# Altium footprint library ParsaLibrary.PcbLib: 526 footprints (part 15 of 33)
Each footprint in its own frame and in the unit in brackets; x right, y up, seen from the top. Pads: shape width x height; smd on the part's side, far side on the other; paste and mask are expansions set on the pad; w line width, h text height; cw(c..) or ccw(c..) is an arc to the next point about the centre after c.
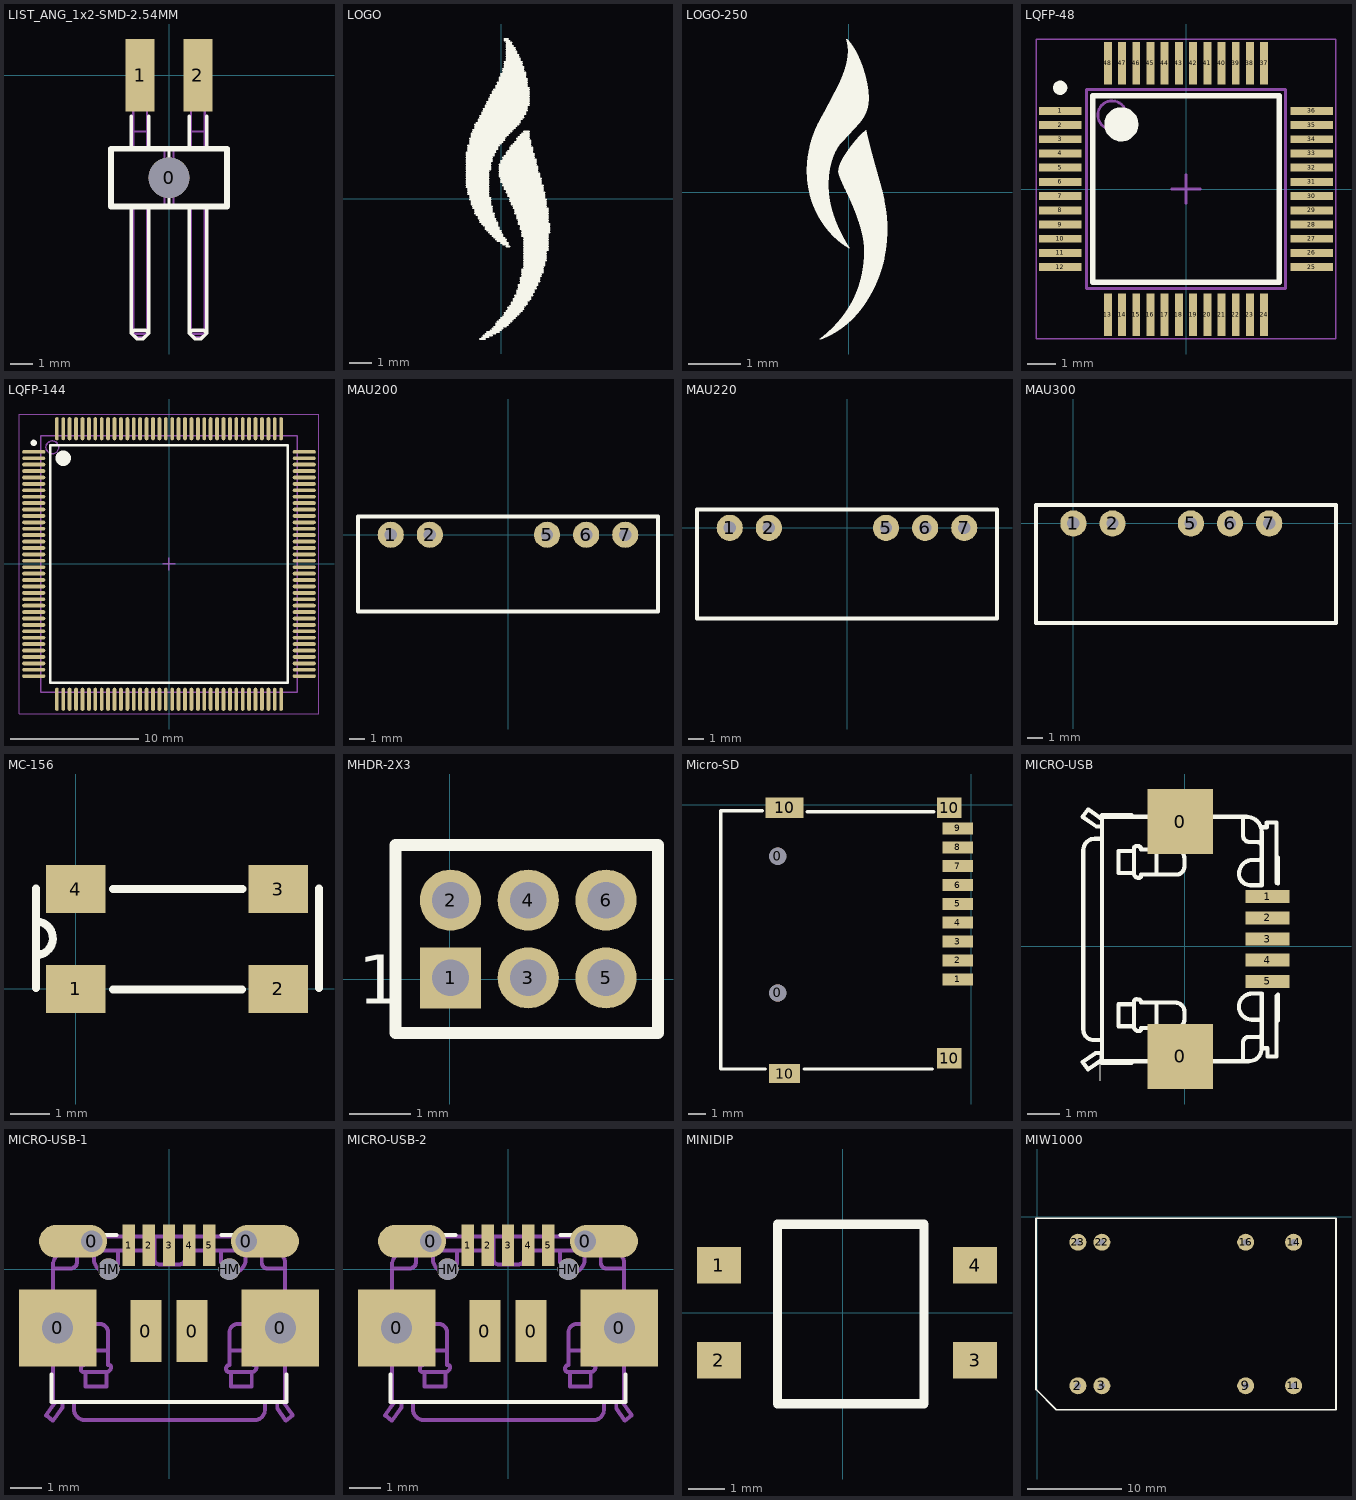
[diagram p14: the footprints below, top view; thin cyan lines are the x and y axes]

## LIST_ANG_1x2-SMD-2.54MM [mm]
pads (3):
  round 1.78 hole 1.78 unplated: 0(0,-4.496)
  rect 1.27x3.18 smd: 1(-1.27,0) 2(1.27,0)
Top Overlay:
  lines w0.15: -1.651,-5.766 -1.651,-11.324 ; -1.651,-3.226 -1.651,-1.8 ; -0.889,-5.766 -0.889,-11.324 ; -0.889,-3.226 -0.889,-1.8 ; 0,-5.766 0,-3.226 ; 0.889,-5.766 0.889,-11.324 ; 0.889,-3.226 0.889,-1.8 ; 1.651,-5.766 1.651,-11.324 ; 1.651,-3.226 1.651,-1.8 ; -1.651,-11.324 -1.524,-11.197 -1.016,-11.197 -0.889,-11.324 ; -1.651,-11.324 -1.397,-11.578 -1.143,-11.578 -0.889,-11.324 ; 0.889,-11.324 1.016,-11.197 1.524,-11.197 1.651,-11.324 ; 0.889,-11.324 1.143,-11.578 1.397,-11.578 1.651,-11.324
  lines w0.254: -2.54,-5.766 2.54,-5.766 2.54,-3.226 -2.54,-3.226 -2.54,-5.766
Mechanical 7:
  lines w0.1: -1.57,-5.766 -1.57,-11.347 ; -1.57,-3.226 -1.57,0.85 ; -1.57,-2.466 -0.97,-2.466 ; -1.57,-0.464 -0.97,-0.464 ; -0.97,-5.766 -0.97,-11.347 ; -0.97,-3.226 -0.97,0.85 ; -0.2,-5.766 -0.2,-3.226 ; 0.2,-5.766 0.2,-3.226 ; 0.97,-5.766 0.97,-11.347 ; 0.97,-3.226 0.97,0.85 ; 0.97,-2.466 1.57,-2.466 ; 0.97,-0.464 1.57,-0.464 ; 1.57,-5.766 1.57,-11.347 ; 1.57,-3.226 1.57,0.85 ; -1.57,-11.347 -1.42,-11.497 -1.12,-11.497 -0.97,-11.347 ; -1.57,-11.347 -0.97,-11.347 ; -1.57,0.85 -1.42,1 -1.12,1 -0.97,0.85 ; -1.57,0.85 -0.97,0.85 ; 0.97,-11.347 1.12,-11.497 1.42,-11.497 1.57,-11.347 ; 0.97,-11.347 1.57,-11.347 ; 0.97,0.85 1.12,1 1.42,1 1.57,0.85 ; 0.97,0.85 1.57,0.85 ; -2.54,-5.766 2.54,-5.766 2.54,-3.226 -2.54,-3.226 -2.54,-5.766
  text ".Designator" at -2,-4.7 h0.38
3D body "Samtec-TSM-102-01-L-SH-A.step": height 3.03, standoff -1.41, extent -2.56,-11.605 2.52,1.349

## LOGO [mm]
Top Overlay:
  drawing of 240 lines, arcs and shapes, not listed

## LOGO-250 [mm]
Top Overlay:
  drawing of 1676 lines, arcs and shapes, not listed

## LQFP-48 [mm]
pads (48):
  rect 1.5x0.28 smd: 1(-4.425,2.75) 2(-4.425,2.25) 3(-4.425,1.75) 4(-4.425,1.25) 5(-4.425,0.75) 6(-4.425,0.25) 7(-4.425,-0.25) 8(-4.425,-0.75) 9(-4.425,-1.25) 10(-4.425,-1.75) 11(-4.425,-2.25) 12(-4.425,-2.75) 25(4.425,-2.75) 26(4.425,-2.25) 27(4.425,-1.75) 28(4.425,-1.25) 29(4.425,-0.75) 30(4.425,-0.25) 31(4.425,0.25) 32(4.425,0.75) 33(4.425,1.25) 34(4.425,1.75) 35(4.425,2.25) 36(4.425,2.75)
  rect 0.28x1.5 smd: 13(-2.75,-4.425) 14(-2.25,-4.425) 15(-1.75,-4.425) 16(-1.25,-4.425) 17(-0.75,-4.425) 18(-0.25,-4.425) 19(0.25,-4.425) 20(0.75,-4.425) 21(1.25,-4.425) 22(1.75,-4.425) 23(2.25,-4.425) 24(2.75,-4.425) 37(2.75,4.425) 38(2.25,4.425) 39(1.75,4.425) 40(1.25,4.425) 41(0.75,4.425) 42(0.25,4.425) 43(-0.25,4.425) 44(-0.75,4.425) 45(-1.25,4.425) 46(-1.75,4.425) 47(-2.25,4.425) 48(-2.75,4.425)
Top Overlay:
  circle w0.6: c-2.275,2.275 r0.3
  circle w0.25: c-4.425,3.56 r0.125
  lines w0.2: -3.275,-3.275 3.275,-3.275 3.275,3.275 -3.275,3.275 -3.275,-3.275
Mechanical 13:
  circle w0.1: c-2.6,2.6 r0.5
  lines w0.1: -3.5,-3.5 3.5,-3.5 3.5,3.5 -3.5,3.5 -3.5,-3.5
Mechanical 15:
  lines w0.05: -5.275,-5.275 5.275,-5.275 5.275,5.275 -5.275,5.275 -5.275,-5.275
  lines w0.1: -0.5,0 0.5,0 ; 0,-0.5 0,0.5
3D body "User Library-LQFP48_Grid_0_5.STEP": height 1.6, standoff 0, extent -4.5,-4.5 4.5,4.5

## LQFP-144 [mm]
pads (144):
  oval 1.8x0.3 smd: 1(-10.551,8.749) 2(-10.551,8.249) 3(-10.551,7.749) 4(-10.551,7.249) 5(-10.551,6.749) 6(-10.551,6.249) 7(-10.551,5.749) 8(-10.551,5.249) 9(-10.551,4.749) 10(-10.551,4.249) 11(-10.551,3.749) 12(-10.551,3.249) 13(-10.551,2.749) 14(-10.551,2.249) 15(-10.551,1.749) 16(-10.551,1.249) 17(-10.551,0.749) 18(-10.551,0.249) 19(-10.551,-0.251) 20(-10.551,-0.751) 21(-10.551,-1.251) 22(-10.551,-1.751) 23(-10.551,-2.251) 24(-10.551,-2.751) 25(-10.551,-3.251) 26(-10.551,-3.751) 27(-10.551,-4.251) 28(-10.551,-4.751) 29(-10.551,-5.251) 30(-10.551,-5.751) 31(-10.551,-6.251) 32(-10.551,-6.751) 33(-10.551,-7.251) 34(-10.551,-7.751) 35(-10.551,-8.251) 36(-10.551,-8.751) 73(10.549,-8.751) 74(10.549,-8.251) 75(10.549,-7.751) 76(10.549,-7.251) 77(10.549,-6.751) 78(10.549,-6.251) 79(10.549,-5.751) 80(10.549,-5.251) 81(10.549,-4.751) 82(10.549,-4.251) 83(10.549,-3.751) 84(10.549,-3.251) 85(10.549,-2.751) 86(10.549,-2.251) 87(10.549,-1.751) 88(10.549,-1.251) 89(10.549,-0.751) 90(10.549,-0.251) 91(10.549,0.249) 92(10.549,0.749) 93(10.549,1.249) 94(10.549,1.749) 95(10.549,2.249) 96(10.549,2.749) 97(10.549,3.249) 98(10.549,3.749) 99(10.549,4.249) 100(10.549,4.749) 101(10.549,5.249) 102(10.549,5.749) 103(10.549,6.249) 104(10.549,6.749) 105(10.549,7.249) 106(10.549,7.749) 107(10.549,8.249) 108(10.549,8.749)
  oval 0.3x1.8 smd: 37(-8.751,-10.551) 38(-8.251,-10.551) 39(-7.751,-10.551) 40(-7.251,-10.551) 41(-6.751,-10.551) 42(-6.251,-10.551) 43(-5.751,-10.551) 44(-5.251,-10.551) 45(-4.751,-10.551) 46(-4.251,-10.551) 47(-3.751,-10.551) 48(-3.251,-10.551) 49(-2.751,-10.551) 50(-2.251,-10.551) 51(-1.751,-10.551) 52(-1.251,-10.551) 53(-0.751,-10.551) 54(-0.251,-10.551) 55(0.249,-10.551) 56(0.749,-10.551) 57(1.249,-10.551) 58(1.749,-10.551) 59(2.249,-10.551) 60(2.749,-10.551) 61(3.249,-10.551) 62(3.749,-10.551) 63(4.249,-10.551) 64(4.749,-10.551) 65(5.249,-10.551) 66(5.749,-10.551) 67(6.249,-10.551) 68(6.749,-10.551) 69(7.249,-10.551) 70(7.749,-10.551) 71(8.249,-10.551) 72(8.749,-10.551) 109(8.749,10.549) 110(8.249,10.549) 111(7.749,10.549) 112(7.249,10.549) 113(6.749,10.549) 114(6.249,10.549) 115(5.749,10.549) 116(5.249,10.549) 117(4.749,10.549) 118(4.249,10.549) 119(3.749,10.549) 120(3.249,10.549) 121(2.749,10.549) 122(2.249,10.549) 123(1.749,10.549) 124(1.249,10.549) 125(0.749,10.549) 126(0.249,10.549) 127(-0.251,10.549) 128(-0.751,10.549) 129(-1.251,10.549) 130(-1.751,10.549) 131(-2.251,10.549) 132(-2.751,10.549) 133(-3.251,10.549) 134(-3.751,10.549) 135(-4.251,10.549) 136(-4.751,10.549) 137(-5.251,10.549) 138(-5.751,10.549) 139(-6.251,10.549) 140(-6.751,10.549) 141(-7.251,10.549) 142(-7.751,10.549) 143(-8.251,10.549) 144(-8.751,10.549)
Top Overlay:
  circle w0.25: c-10.551,9.449 r0.125
  circle w0.6: c-8.251,8.249 r0.3
  lines w0.2: -9.251,-9.251 -9.251,9.249 9.249,9.249 9.249,-9.251 -9.251,-9.251
Mechanical 13:
  circle w0.1: c-9.101,9.099 r0.5
  lines w0.1: -10.001,-10.001 -10.001,9.999 9.999,9.999 9.999,-10.001 -10.001,-10.001
Mechanical 15:
  lines w0.05: -11.701,-11.701 -11.701,11.699 11.699,11.699 11.699,-11.701 -11.701,-11.701
  lines w0.1: -0.501,-0.001 0.499,-0.001 ; -0.001,-0.501 -0.001,0.499
3D body "User Library-LQFP144-3.STEP": height 1.8, standoff -0.09, extent -11.102,-11.102 11.1,11.1

## MAU200 [mm]
pads (5):
  round 1.7 hole 0.8: 1(-7.62,0) 2(-5.08,0) 5(2.54,0) 6(5.08,0) 7(7.62,0)
Top Overlay:
  lines w0.254: -9.75,-5 -9.75,1.2 9.75,1.2 9.75,-5 -9.75,-5
3D body "User Library-MAU.SLDPRT": height 9.7, standoff -3.7, extent -9.75,-5 9.75,1.2

## MAU220 [mm]
pads (5):
  round 1.7 hole 0.8: 1(-7.62,0) 2(-5.08,0) 5(2.54,0) 6(5.08,0) 7(7.62,0)
Top Overlay:
  lines w0.254: -9.75,-5.9 -9.75,1.2 9.75,1.2 9.75,-5.9 -9.75,-5.9
3D body: height 10.2, standoff 0, extent -9.75,-5.9 9.75,-4.9
3D body "User Library-MAU.SLDPRT": height 10.2, standoff -3.2, extent -9.75,-5 9.75,1.2

## MAU300 [mm]
pads (5):
  round 1.7 hole 0.8: 1(0,0) 2(2.54,0) 5(7.62,0) 6(10.16,0) 7(12.7,0)
Top Overlay:
  lines w0.254: -2.424,-6.468 -2.424,1.2 17.032,1.2 17.032,-6.468 -2.424,-6.468
3D body "User Library-MAU302.step": height 9.7, standoff -3.5, extent -2.433,-6.417 17.067,1.183

## MC-156 [mm]
pads (4):
  rect 1.5x1.2 smd: 1(0,0) 2(5.08,0) 3(5.08,2.5) 4(0,2.5)
Top Overlay:
  lines w0.2: -0.999,0.018 -0.999,2.518 ; -0.996,0.844 ccw(c-0.999,1.268) -0.971,1.692 ; 0.93,-0.013 4.172,-0.013 ; 0.939,2.5 4.181,2.5 ; 6.101,0.018 6.101,2.518
3D body "User Library-EA96.step": height 1.3, standoff -0.2, extent -1.012,-0.288 6.088,2.812

## MHDR-2X3 [mm]
pads (6):
  rect 1x1 hole 0.6: 1(0.011,0.019)
  round 1 hole 0.6: 2(0.011,1.289) 3(1.281,0.019) 4(1.281,1.289) 5(2.551,0.019) 6(2.551,1.289)
Top Overlay:
  lines w0.2: -0.889,-0.881 -0.889,2.189 3.4,2.189 3.4,-0.881 -0.889,-0.881
  text "1" at -1.5,-0.4 h0.8

## Micro-SD [mm]
pads (15):
  round 1 hole 1: 0(-11.287,-10.985) 0(-11.287,-3.005)
  rect 1.8x0.7 smd: 1(-0.787,-10.185) 2(-0.787,-9.085) 3(-0.787,-7.985) 4(-0.787,-6.885) 5(-0.787,-5.785) 6(-0.787,-4.685) 7(-0.787,-3.585) 8(-0.787,-2.485) 9(-0.787,-1.385)
  rect 1.8x1.1 smd: 10(-10.887,-15.685)
  rect 2.2x1.2 smd: 10(-10.887,-0.185)
  rect 1.44x1.2 smd: 10(-1.287,-14.785) 10(-1.287,-0.185)
Top Overlay:
  lines w0.2: -12.192,-0.356 -14.605,-0.356 -14.605,-15.418 -12.014,-15.418 ; -9.754,-15.418 -2.261,-15.418 ; -9.576,-0.406 -2.184,-0.406
3D body "MicroSDSlot.STEP": height 1.75, standoff -0.69, extent -14.949,-15.924 0.051,0.076

## MICRO-USB [mm]
pads (7):
  rect 2x2 smd: 0(-0.135,-3.376) 0(-0.135,3.824)
  rect 1.35x0.4 smd: 1(2.54,1.524) 2(2.54,0.874) 3(2.54,0.224) 4(2.54,-0.426) 5(2.54,-1.076)
Top Overlay:
  lines w0: -2.585,-4.126 -2.585,-3.276
  lines w0.127: -2.585,-3.276 -2.735,-3.276 -3.135,-3.551 -2.96,-3.776 -2.535,-3.476 ; -1.635,-3.576 -2.535,-3.576 -2.535,4.024 -1.635,4.024 ; -1.56,-2.476 -1.56,-1.776 ; -1.56,2.224 -1.56,2.924 ; -0.86,-2.476 -0.86,-1.726 ; -0.86,2.224 -0.86,2.974 ; 1.79,-3.501 1.79,-2.951 cw(c1.965,-2.951) 1.965,-2.776 2.29,-2.776 ccw(c2.29,-2.701) 2.365,-2.701 ; 1.79,3.949 1.79,3.399 ccw(c1.99,3.399) 1.99,3.199 2.215,3.199 cw(c2.215,3.049) 2.365,3.049 ; 2.39,3.649 2.515,3.649 2.515,3.799 2.815,3.799 2.815,1.949 ; 2.815,-1.526 2.815,-3.376 2.54,-3.376 2.54,-3.126 2.365,-3.126 ; 2.865,-2.276 2.865,-1.476 ; 2.865,1.924 2.865,2.724 ; -2.535,-3.476 -2.535,-2.876 ; -2.535,-3.476 -2.535,-3.526 1.965,-3.526 ccw(c1.965,-3.126) 2.365,-3.126 ; -2.535,-2.876 -2.535,3.299 ; -2.535,-2.876 -2.785,-2.876 cw(c-2.785,-2.551) -3.11,-2.551 -3.11,2.949 cw(c-2.76,2.949) -2.76,3.299 -2.535,3.299 ; -2.535,3.299 -2.535,3.674 ; -2.535,3.674 -2.535,3.899 ; -2.535,3.674 -2.71,3.674 -3.135,3.974 -2.96,4.199 -2.535,3.899 ; -2.535,3.899 -2.535,3.974 1.89,3.974 cw(c1.89,3.499) 2.365,3.499 2.365,3.049 ; -1.56,-1.776 -1.56,-1.701 cw(c-1.472,-1.713) -1.46,-1.626 -1.435,-1.626 cw(c-1.435,-1.726) -1.335,-1.726 -0.86,-1.726 ; -1.56,-1.776 -2.035,-1.776 -2.035,-2.451 -1.56,-2.451 ccw(c-1.41,-2.451) -1.41,-2.601 ccw(c-1.41,-2.526) -1.335,-2.526 -1.335,-2.501 -0.26,-2.501 ccw(c-0.26,-2.251) -0.01,-2.251 -0.01,-2.001 ccw(c-0.285,-2.001) -0.285,-1.726 -0.86,-1.726 ; -1.56,2.924 -1.56,2.999 cw(c-1.473,2.986) -1.46,3.074 -1.435,3.074 cw(c-1.435,2.974) -1.335,2.974 -0.86,2.974 ; -1.56,2.924 -2.035,2.924 -2.035,2.249 -1.56,2.249 ccw(c-1.41,2.249) -1.41,2.099 ccw(c-1.41,2.174) -1.335,2.174 -1.335,2.199 -0.26,2.199 ccw(c-0.26,2.449) -0.01,2.449 -0.01,2.699 ccw(c-0.285,2.699) -0.285,2.974 -0.86,2.974 ; 2.365,-3.126 2.365,-2.701 ; 2.365,-2.701 2.365,-2.251 ; 2.365,-2.251 2.365,-1.451 2.065,-1.451 ccw(c2.065,-1.851) 1.665,-1.851 ccw(c2.065,-1.851) 2.065,-2.251 2.365,-2.251 ; 2.365,2.724 cw(c2.29,2.724) 2.29,2.649 2.09,2.649 ccw(c2.09,2.224) 1.665,2.224 ccw(c2.015,2.224) 2.015,1.874 2.365,1.874 2.365,2.724 ; 2.365,2.724 2.365,3.049
Mechanical 1:
  lines w0: -0.685,-3.376 ccw(c-0.41,-3.401) -0.435,-3.676 0.165,-3.676 ccw(c0.14,-3.401) 0.415,-3.376 ccw(c0.14,-3.351) 0.165,-3.076 -0.435,-3.076 ccw(c-0.41,-3.351) -0.685,-3.376 ; -0.685,3.824 ccw(c-0.41,3.799) -0.435,3.524 0.165,3.524 ccw(c0.14,3.799) 0.415,3.824 ccw(c0.14,3.849) 0.165,4.124 -0.435,4.124 ccw(c-0.41,3.849) -0.685,3.824
3D body "User Library-10104110.step": height 2.72, standoff -0.31, extent -2.715,-3.912 2.849,4.166

## MICRO-USB-1 [mm]
pads (13):
  rect 2.5x2.5 hole 1: 0(-3.6,-1.9) 0(3.6,-1.9)
  oval 2.2x1.05 hole 0.7 copper offset -0.6,0: 0(-2.5,0.9)
  rect 1x2 smd: 0(-0.75,-2) 0(0.75,-2)
  rrect100% 2.2x1.05 hole 0.7 copper offset 0.6,0: 0(2.5,0.9)
  rect 0.4x1.35 smd: 1(-1.3,0.775) 2(-0.65,0.775) 3(0,0.775) 4(0.65,0.775) 5(1.3,0.775)
  round 0.7 hole 0.7: HM(-1.95,0) HM(1.95,0)
Top Overlay:
  lines w0.127: -3.8,-3.4 -3.8,-4.3 3.8,-4.3 3.8,-3.4 ; -2.5,1.1 -1.7,1.1 ; 1.7,1.1 2.5,1.1
Mechanical 1:
  lines w0: -3.9,-2.2 ccw(c-3.625,-2.175) -3.6,-2.45 ccw(c-3.575,-2.175) -3.3,-2.2 -3.3,-1.6 ccw(c-3.575,-1.625) -3.6,-1.35 ccw(c-3.625,-1.625) -3.9,-1.6 -3.9,-2.2 ; 3.3,-2.2 ccw(c3.575,-2.175) 3.6,-2.45 ccw(c3.625,-2.175) 3.9,-2.2 3.9,-1.6 ccw(c3.625,-1.625) 3.6,-1.35 ccw(c3.575,-1.625) 3.3,-1.6 3.3,-2.2
Mechanical 16:
  lines w0.127: -3.725,0.025 -3.175,0.025 ccw(c-3.175,0.225) -2.975,0.225 -2.975,0.45 cw(c-2.825,0.45) -2.825,0.6 ; -3.425,0.625 -3.425,0.75 -3.575,0.75 -3.575,1.05 -0.475,1.05 ; -2,-3.325 -2.7,-3.325 ; -2,-2.625 -2.75,-2.625 ; -0.125,0.175 -0.125,0.65 0.1,0.65 0.1,0.175 ; 2.7,-3.325 2,-3.325 ; 2.7,-2.625 1.95,-2.625 ; 3.5,-4.35 3.5,-4.5 3.775,-4.9 4,-4.725 3.7,-4.3 ; 3.725,0.025 3.175,0.025 cw(c3.175,0.2) 3,0.2 3,0.525 ccw(c2.925,0.525) 2.925,0.6 ; -3.675,-4.3 -3.975,-4.725 -3.75,-4.9 -3.45,-4.475 -3.45,-4.3 ; -3.675,-4.3 -3.45,-4.3 ; -3.675,-4.3 -3.75,-4.3 -3.75,0.125 cw(c-3.275,0.125) -3.275,0.6 -2.825,0.6 ; -3.45,-4.3 -3.075,-4.3 ; -3.075,-4.3 -3.075,-4.525 ccw(c-2.725,-4.525) -2.725,-4.875 2.775,-4.875 ccw(c2.775,-4.55) 3.1,-4.55 3.1,-4.3 ; -3.075,-4.3 3.1,-4.3 ; -2.825,0.6 -2.5,0.6 ; -2.75,-2.625 -2.75,-2.05 cw(c-2.475,-2.05) -2.475,-1.775 -2.225,-1.775 cw(c-2.225,-2.025) -1.975,-2.025 -1.975,-3.1 -1.95,-3.1 cw(c-1.95,-3.175) -1.875,-3.175 cw(c-2.025,-3.175) -2.025,-3.325 -2.025,-3.8 -2.7,-3.8 -2.7,-3.325 ; -2.75,-2.625 -2.75,-3.1 ccw(c-2.75,-3.2) -2.85,-3.2 -2.85,-3.225 ccw(c-2.762,-3.238) -2.775,-3.325 -2.7,-3.325 ; -2.5,0.6 cw(c-2.5,0.525) -2.425,0.525 -2.425,0.325 ccw(c-2,0.325) -2,-0.1 ccw(c-2,0.25) -1.65,0.25 -1.65,0.6 ; -2.5,0.6 -1.65,0.6 ; -1.65,0.6 -0.475,0.6 ; -0.475,0.6 -0.475,1.05 ; -0.475,0.6 -0.475,0.325 ccw(c-0.3,0.325) -0.3,0.15 0.325,0.15 ccw(c0.325,0.35) 0.525,0.35 0.525,0.6 ; -0.475,1.05 0.525,1.05 ; 0.525,0.6 0.525,1.05 ; 0.525,0.6 1.675,0.6 ; 0.525,1.05 3.6,1.05 3.6,0.775 3.35,0.775 3.35,0.6 ; 1.675,0.6 1.675,0.3 ccw(c2.075,0.3) 2.075,-0.1 ccw(c2.075,0.3) 2.475,0.3 2.475,0.6 ; 1.675,0.6 2.475,0.6 ; 1.95,-2.625 1.95,-2.05 cw(c2.225,-2.05) 2.225,-1.775 2.475,-1.775 cw(c2.475,-2.025) 2.725,-2.025 2.725,-3.1 2.75,-3.1 cw(c2.75,-3.175) 2.825,-3.175 cw(c2.675,-3.175) 2.675,-3.325 2.675,-3.8 2,-3.8 2,-3.325 ; 1.95,-2.625 1.95,-3.1 ccw(c1.95,-3.2) 1.85,-3.2 1.85,-3.225 ccw(c1.938,-3.237) 1.925,-3.325 2,-3.325 ; 2.475,0.6 2.925,0.6 ; 2.925,0.6 3.35,0.6 ; 3.1,-4.3 3.7,-4.3 ; 3.35,0.6 cw(c3.35,0.2) 3.75,0.2 3.75,-4.3 3.7,-4.3
3D body "User Library-10118194.step": height 2.73, standoff -0.55, extent -4.025,-4.6 4.025,0.98

## MICRO-USB-2 [mm]
pads (13):
  rect 2.5x2.5 hole 1: 0(-3.6,-1.9) 0(3.6,-1.9)
  oval 2.2x1.05 hole 0.7 copper offset -0.6,0: 0(-2.5,0.9)
  rect 1x2 smd: 0(-0.75,-2) 0(0.75,-2)
  rrect100% 2.2x1.05 hole 0.7 copper offset 0.6,0: 0(2.5,0.9)
  rect 0.4x1.35 smd: 1(-1.3,0.775) 2(-0.65,0.775) 3(0,0.775) 4(0.65,0.775) 5(1.3,0.775)
  round 0.7 hole 0.7: HM(-1.95,0) HM(1.95,0)
Top Overlay:
  lines w0.127: -3.8,-3.4 -3.8,-4.3 3.8,-4.3 3.8,-3.4 ; -2.5,1.1 -1.7,1.1 ; 1.7,1.1 2.5,1.1
Mechanical 1:
  lines w0: -3.9,-2.2 ccw(c-3.625,-2.175) -3.6,-2.45 ccw(c-3.575,-2.175) -3.3,-2.2 -3.3,-1.6 ccw(c-3.575,-1.625) -3.6,-1.35 ccw(c-3.625,-1.625) -3.9,-1.6 -3.9,-2.2 ; 3.3,-2.2 ccw(c3.575,-2.175) 3.6,-2.45 ccw(c3.625,-2.175) 3.9,-2.2 3.9,-1.6 ccw(c3.625,-1.625) 3.6,-1.35 ccw(c3.575,-1.625) 3.3,-1.6 3.3,-2.2
Mechanical 16:
  lines w0.127: -3.725,0.025 -3.175,0.025 ccw(c-3.175,0.225) -2.975,0.225 -2.975,0.45 cw(c-2.825,0.45) -2.825,0.6 ; -3.425,0.625 -3.425,0.75 -3.575,0.75 -3.575,1.05 -0.475,1.05 ; -2,-3.325 -2.7,-3.325 ; -2,-2.625 -2.75,-2.625 ; -0.125,0.175 -0.125,0.65 0.1,0.65 0.1,0.175 ; 2.7,-3.325 2,-3.325 ; 2.7,-2.625 1.95,-2.625 ; 3.5,-4.35 3.5,-4.5 3.775,-4.9 4,-4.725 3.7,-4.3 ; 3.725,0.025 3.175,0.025 cw(c3.175,0.2) 3,0.2 3,0.525 ccw(c2.925,0.525) 2.925,0.6 ; -3.675,-4.3 -3.975,-4.725 -3.75,-4.9 -3.45,-4.475 -3.45,-4.3 ; -3.675,-4.3 -3.45,-4.3 ; -3.675,-4.3 -3.75,-4.3 -3.75,0.125 cw(c-3.275,0.125) -3.275,0.6 -2.825,0.6 ; -3.45,-4.3 -3.075,-4.3 ; -3.075,-4.3 -3.075,-4.525 ccw(c-2.725,-4.525) -2.725,-4.875 2.775,-4.875 ccw(c2.775,-4.55) 3.1,-4.55 3.1,-4.3 ; -3.075,-4.3 3.1,-4.3 ; -2.825,0.6 -2.5,0.6 ; -2.75,-2.625 -2.75,-2.05 cw(c-2.475,-2.05) -2.475,-1.775 -2.225,-1.775 cw(c-2.225,-2.025) -1.975,-2.025 -1.975,-3.1 -1.95,-3.1 cw(c-1.95,-3.175) -1.875,-3.175 cw(c-2.025,-3.175) -2.025,-3.325 -2.025,-3.8 -2.7,-3.8 -2.7,-3.325 ; -2.75,-2.625 -2.75,-3.1 ccw(c-2.75,-3.2) -2.85,-3.2 -2.85,-3.225 ccw(c-2.762,-3.238) -2.775,-3.325 -2.7,-3.325 ; -2.5,0.6 cw(c-2.5,0.525) -2.425,0.525 -2.425,0.325 ccw(c-2,0.325) -2,-0.1 ccw(c-2,0.25) -1.65,0.25 -1.65,0.6 ; -2.5,0.6 -1.65,0.6 ; -1.65,0.6 -0.475,0.6 ; -0.475,0.6 -0.475,1.05 ; -0.475,0.6 -0.475,0.325 ccw(c-0.3,0.325) -0.3,0.15 0.325,0.15 ccw(c0.325,0.35) 0.525,0.35 0.525,0.6 ; -0.475,1.05 0.525,1.05 ; 0.525,0.6 0.525,1.05 ; 0.525,0.6 1.675,0.6 ; 0.525,1.05 3.6,1.05 3.6,0.775 3.35,0.775 3.35,0.6 ; 1.675,0.6 1.675,0.3 ccw(c2.075,0.3) 2.075,-0.1 ccw(c2.075,0.3) 2.475,0.3 2.475,0.6 ; 1.675,0.6 2.475,0.6 ; 1.95,-2.625 1.95,-2.05 cw(c2.225,-2.05) 2.225,-1.775 2.475,-1.775 cw(c2.475,-2.025) 2.725,-2.025 2.725,-3.1 2.75,-3.1 cw(c2.75,-3.175) 2.825,-3.175 cw(c2.675,-3.175) 2.675,-3.325 2.675,-3.8 2,-3.8 2,-3.325 ; 1.95,-2.625 1.95,-3.1 ccw(c1.95,-3.2) 1.85,-3.2 1.85,-3.225 ccw(c1.938,-3.237) 1.925,-3.325 2,-3.325 ; 2.475,0.6 2.925,0.6 ; 2.925,0.6 3.35,0.6 ; 3.1,-4.3 3.7,-4.3 ; 3.35,0.6 cw(c3.35,0.2) 3.75,0.2 3.75,-4.3 3.7,-4.3
3D body "User Library-10118194.step": height 2.73, standoff -0.55, extent -4.025,-4.6 4.025,0.98

## MINIDIP [mm]
pads (4):
  rect 1.2x1 smd: 1(-3.381,1.3) 2(-3.381,-1.3) 3(3.619,-1.3) 4(3.619,1.3)
Top Overlay:
  lines w0.254: -1.778,-2.487 2.222,-2.487 2.222,2.413 -1.778,2.413 -1.778,-2.487
3D body "User Library-HD01-T.STEP": height 2.65, standoff 0, extent -3.473,-2.436 3.527,2.465

## MIW1000 [mm] "DC/DC CONVERTER"
pads (8):
  round 1.8 hole 0.7: 2(4.318,-17.907) 3(6.858,-17.907) 9(22.098,-17.907) 11(27.178,-17.907) 14(27.178,-2.687) 16(22.098,-2.687) 22(6.858,-2.687) 23(4.318,-2.687)
Top Overlay:
  lines w0.2: -0.127,-0.147 -0.127,-18.288 2.032,-20.447 31.673,-20.447 ; -0.072,-0.147 31.678,-0.147 31.678,-20.447